# Altium footprint library RPSLib_Connectors.PcbLib: 85 footprints (part 4 of 6)
Each footprint in its own frame and in the unit in brackets; x right, y up, seen from the top. Pads: shape width x height; smd on the part's side, far side on the other; paste and mask are expansions set on the pad; w line width, h text height; cw(c..) or ccw(c..) is an arc to the next point about the centre after c.
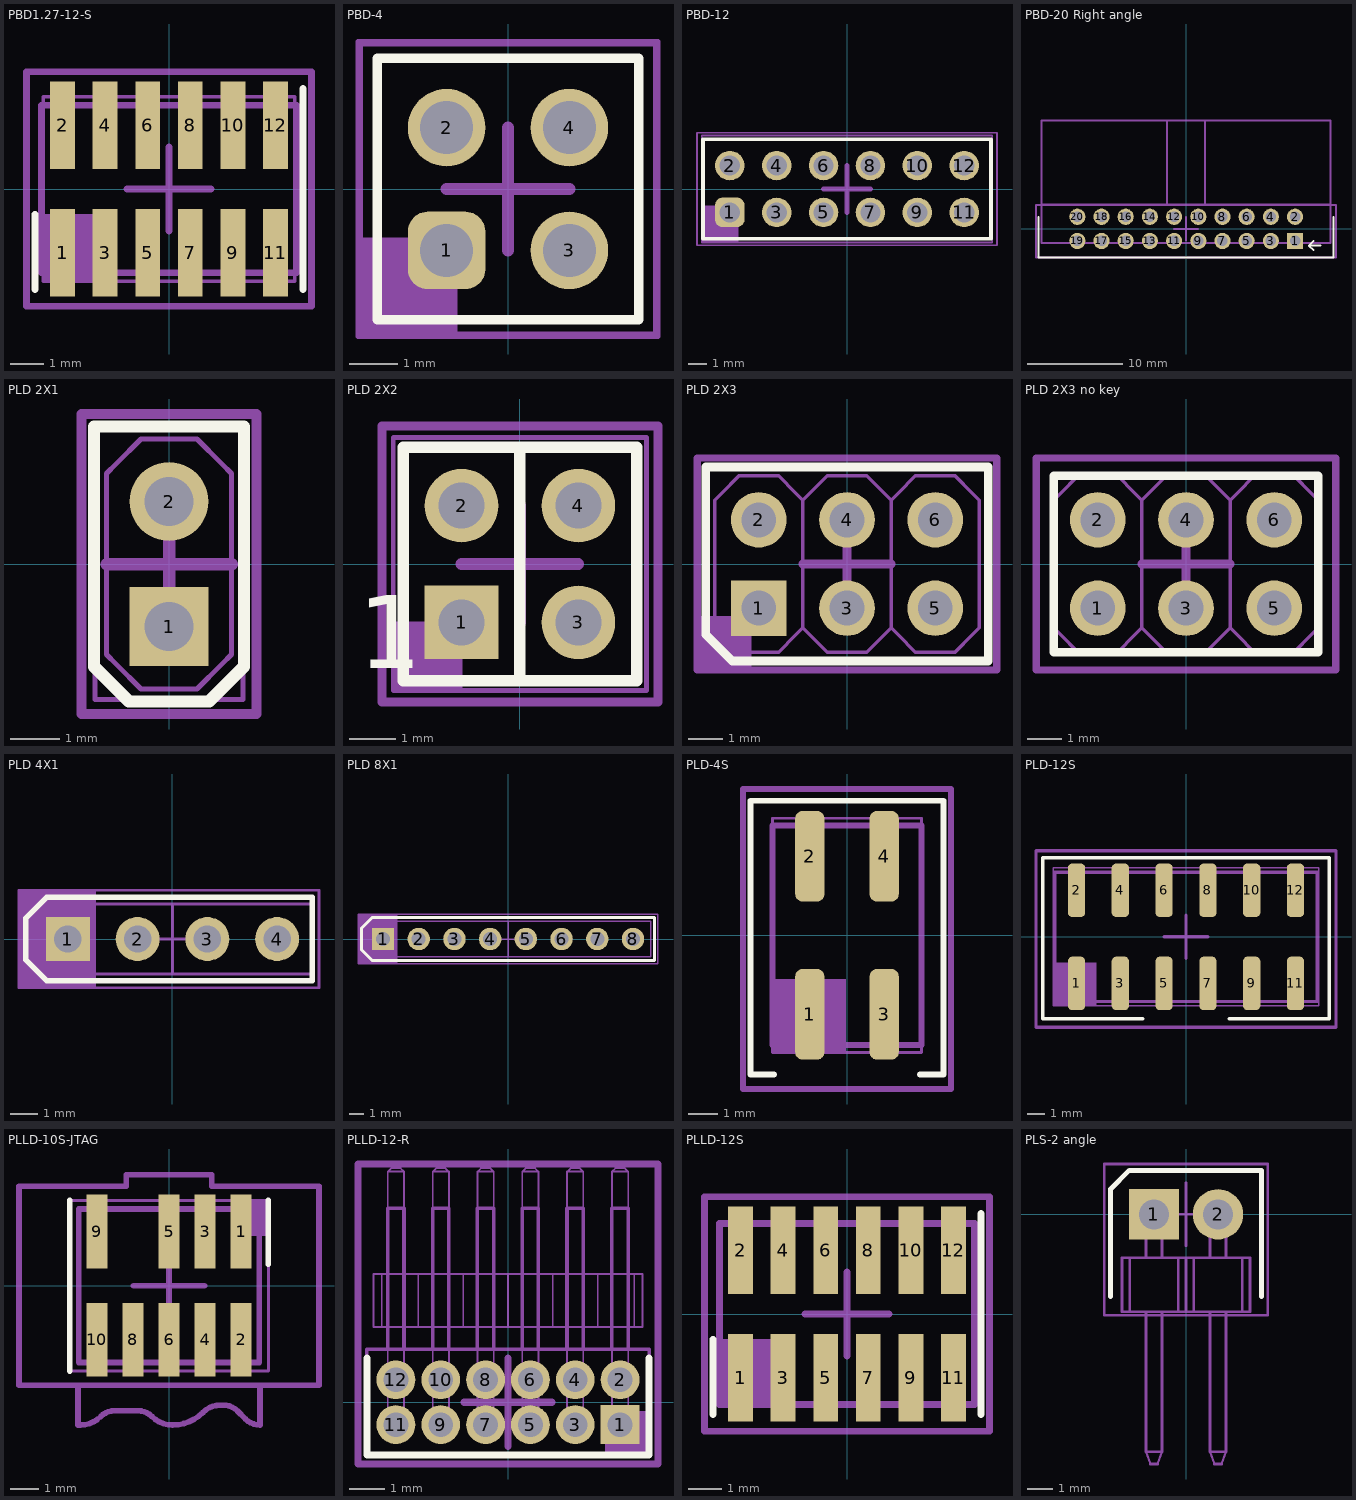
[diagram p3: the footprints below, top view; thin cyan lines are the x and y axes]

## PBD1.27-12-S [mm]
height 4.5
pads (12):
  rect 0.74x2.6 smd mask+0.07: 1(-3.175,-1.9) 2(-3.175,1.9) 3(-1.905,-1.9) 4(-1.905,1.9) 5(-0.635,-1.9) 6(-0.635,1.9) 7(0.635,-1.9) 8(0.635,1.9) 9(1.905,-1.9) 10(1.905,1.9) 11(3.175,-1.9) 12(3.175,1.9)
Top Overlay:
  lines w0.2: -4,-3 -4,-0.75 ; 4,-3 4,3
Top Designator:
  rectangle: -3.75,-2.75 -1.75,-0.75
  lines w0.1: -3.75,-2.75 3.75,-2.75 3.75,2.75 -3.75,2.75 -3.75,-2.75
  text ".Designator" at -2.868,-0.271 h1.2
Top Courtyard:
  lines w0.2: -1.25,0 1.25,0 ; 0,-1.25 0,1.25 ; -4.25,-3.5 -4.25,3.5 4.25,3.5 4.25,-3.5 -4.25,-3.5
Top 3D Body:
  lines w0.2: -3.81,-2.5 -3.81,2.5 3.81,2.5 3.81,-2.5 -3.81,-2.5
20:
  text ".Designator" at -1.126,-0.113 h0.5
3D body "User Library-PBD1_27-xx-S.step": height 4.5, standoff 0, extent -3.81,-2.5 3.81,2.5

## PBD-4 [mm] "Розетка двухрядная"
height 8.5
pads (4):
  rrect50% 1.6x1.6 hole 1.1: 1(-1.27,-1.27)
  round 1.6 hole 1.1: 2(-1.27,1.27) 3(1.27,-1.27) 4(1.27,1.27)
Top Overlay:
  lines w0.2: -2.7,-2.7 2.7,-2.7 2.7,2.7 -2.7,2.7 -2.7,-2.7
Top Designator:
  rectangle: -3.048,-3 -1.048,-1
  lines w0.1: -3.048,-3 -3.048,3 3.048,3 3.048,-3 -3.048,-3
  text ".Designator" at -2.868,-0.271 h1.2
Top Courtyard:
  lines w0.1: -3.1,-3.048 3.1,-3.048 3.1,3.048 -3.1,3.048 -3.1,-3.048
  lines w0.254: -1.27,0 1.27,0 ; 0,-1.27 0,1.27
20:
  text ".Designator" at -2.253,-0.226 h1
3D body "PBD-4.stp": height 8.5, standoff -3.1, extent -2.54,-2.54 2.54,2.54

## PBD-12 [mm] "Розетка двухрядная"
height 8.5
pads (12):
  rrect50% 1.6x1.6 hole 1.1: 1(-6.35,-1.27)
  round 1.6 hole 1.1: 2(-6.35,1.27) 3(-3.81,-1.27) 4(-3.81,1.27) 5(-1.27,-1.27) 6(-1.27,1.27) 7(1.27,-1.27) 8(1.27,1.27) 9(3.81,-1.27) 10(3.81,1.27) 11(6.35,-1.27) 12(6.35,1.27)
Top Overlay:
  lines w0.2: -7.8,-2.7 -7.8,2.7 7.8,2.7 7.8,-2.7 -7.8,-2.7
Top Designator:
  rectangle: -7.874,-2.9 -5.874,-0.9
  lines w0.1: -7.874,-2.9 7.874,-2.9 7.874,2.9 -7.874,2.9 -7.874,-2.9
  text ".Designator" at -2.868,-0.271 h1.2
Top Courtyard:
  lines w0.1: -8.128,-3.048 -8.128,3.048 8.128,3.048 8.128,-3.048 -8.128,-3.048
  lines w0.254: -1.27,0 1.27,0 ; 0,-1.27 0,1.27
20:
  text ".Designator" at -2.253,-0.226 h1
3D body "PBD-12.stp": height 8.5, standoff -3.1, extent -7.62,-2.54 7.62,2.54

## PBD-20 Right angle [mm] "2.54 мм разъем правый"
height 9.1
pads (20):
  rect 1.7x1.7 hole 1.1: 1(11.45,-1.27)
  round 1.7 hole 1.1: 2(11.45,1.27) 3(8.91,-1.27) 4(8.91,1.27) 5(6.37,-1.27) 6(6.37,1.27) 7(3.83,-1.27) 8(3.83,1.27) 9(1.29,-1.27) 10(1.29,1.27) 11(-1.25,-1.27) 12(-1.25,1.27) 13(-3.79,-1.27) 14(-3.79,1.27) 15(-6.33,-1.27) 16(-6.33,1.27) 17(-8.87,-1.27) 18(-8.87,1.27) 19(-11.41,-1.27) 20(-11.41,1.27)
Top Overlay:
  lines w0.2: -15.5,1.25 -15.5,-3 15.5,-3 15.5,1.25 ; 13.403,-2.25 12.903,-1.75 ; 13.403,-1.25 12.903,-1.75 ; 14.153,-1.75 12.903,-1.75
Top Designator:
  text ".Designator" at -2.868,-0.271 h1.2
Top Courtyard:
  lines w0.2: -1.25,0 1.25,0 ; 0,-1.25 0,1.25 ; -15.75,-3 -15.75,2.5 15.75,2.5 15.75,-3 -15.75,-3
Top 3D Body:
  lines w0.2: -15.16,2.548 15.16,2.548 ; -2,11.37 -2,2.548 2,2.548 2,11.37 ; -15.16,-1.47 15.16,-1.47 15.16,11.37 -15.16,11.37 -15.16,-1.47
3D body "PBD-20.stp": height 7.1, standoff -2.7, extent -15.16,-1.47 15.16,11.37

## PLD 2X1 [mm]
pads (2):
  rect 1.6x1.6 hole 1: 1(0,-1.27)
  round 1.6 hole 1: 2(0,1.27)
Top Overlay:
  lines w0.25: -1.524,-2.086 -0.816,-2.794 0.816,-2.794 1.524,-2.086 1.524,2.794 -1.524,2.794 -1.524,-2.086
Top Designator:
  lines w0.1: -1.5,-2.75 1.5,-2.75 1.5,2.75 -1.5,2.75 -1.5,-2.75
  text ".Designator" at -2.868,-0.271 h1.2
Top Courtyard:
  lines w0.2: -1.778,-3.048 -1.778,3.048 1.778,3.048 1.778,-3.048 -1.778,-3.048
  lines w0.254: -1.27,0 1.27,0 ; 0,-1.27 0,1.27
Top 3D Body:
  lines w0.1: -1.27,-1.84 -1.07,-2.04 -0.57,-2.54 0.57,-2.54 1.07,-2.04 1.27,-1.84 ; -1.27,-1.84 -1.27,1.84 ; -1.27,-1.84 -1.27,1.84 ; -1.27,1.84 -1.07,2.04 -0.57,2.54 0.57,2.54 1.07,2.04 1.27,1.84 ; 1.27,-1.84 1.27,1.84 ; 1.27,-1.84 1.27,1.84 ; -0.32,-1.59 -0.32,-0.95 0.32,-0.95 0.32,-1.59 -0.32,-1.59 ; -0.32,0.95 -0.32,1.59 0.32,1.59 0.32,0.95 -0.32,0.95
20:
  text ".Designator" at 0.226,-2.253 h1
3D body "PLD-2x1.stp": height 8.54, standoff -3, extent -1.27,-2.54 1.27,2.54

## PLD 2X2 [mm]
pads (4):
  rect 1.6x1.6 hole 1: 1(-1.27,-1.27)
  round 1.6 hole 1: 2(-1.27,1.27) 3(1.27,-1.27) 4(1.27,1.27)
Top Overlay:
  lines w0.25: 0,-2.54 0,2.54 ; -2.54,-2.54 -2.54,2.54 2.54,2.54 2.54,-2.54 -2.54,-2.54
  text "1" at -3.52,-2.27 h1.59
Top Designator:
  rectangle: -2.75,-2.75 -1.25,-1.25
  lines w0.1: -2.75,-2.75 -2.75,2.75 2.75,2.75 2.75,-2.75 -2.75,-2.75
  text ".Designator" at -2.868,-0.271 h1.2
Top Courtyard:
  lines w0.2: -3,-3 -3,3 3,3 3,-3 -3,-3
  lines w0.254: -1.27,0 1.27,0 ; 0,-1.27 0,1.27
Top 3D Body:
  lines w0.2: -2.54,-2.54 -2.54,2.54 2.54,2.54 2.54,-2.54 -2.54,-2.54
20:
  text ".Designator" at -2.253,-0.226 h1
3D body "PLD-4.stp": height 8, standoff -3, extent -2.54,-2.54 2.54,2.54

## PLD 2X3 [mm]
pads (6):
  rect 1.6x1.6 hole 1: 1(-2.54,-1.27)
  round 1.6 hole 1: 2(-2.54,1.27) 3(0,-1.27) 4(0,1.27) 5(2.54,-1.27) 6(2.54,1.27)
Top Overlay:
  lines w0.25: -4.064,-2.032 -3.302,-2.794 4.064,-2.794 4.064,2.794 -4.064,2.794 -4.064,-2.032
Top Designator:
  rectangle: -4.25,-3 -2.75,-1.5
  lines w0.1: -4.25,-3 -4.25,3 4.25,3 4.25,-3 -4.25,-3
  text ".Designator" at -2.868,-0.271 h1.2
Top Courtyard:
  lines w0.2: -4.318,-3.048 4.318,-3.048 4.318,3.048 -4.318,3.048 -4.318,-3.048
  lines w0.254: -1.27,0 1.27,0 ; 0,-1.27 0,1.27
Top 3D Body:
  lines w0.1: -1.27,-1.84 -1.27,1.84 ; -1.27,-1.84 -1.27,1.84 ; -1.27,-1.84 -1.47,-2.04 -1.97,-2.54 -3.11,-2.54 -3.61,-2.04 -3.81,-1.84 -3.81,1.84 -3.61,2.04 -3.11,2.54 -1.97,2.54 -1.47,2.04 -1.27,1.84 ; -1.27,-1.84 -1.07,-2.04 -0.57,-2.54 0.57,-2.54 1.07,-2.04 1.27,-1.84 ; -1.27,1.84 -1.07,2.04 -0.57,2.54 0.57,2.54 1.07,2.04 1.27,1.84 ; 1.27,-1.84 1.27,1.84 ; 1.27,-1.84 1.27,1.84 ; 1.27,-1.84 1.47,-2.04 1.97,-2.54 3.11,-2.54 3.61,-2.04 3.81,-1.84 3.81,1.84 3.61,2.04 3.11,2.54 1.97,2.54 1.47,2.04 1.27,1.84 ; -2.86,-1.59 -2.22,-1.59 -2.22,-0.95 -2.86,-0.95 -2.86,-1.59 ; -2.86,0.95 -2.86,1.59 -2.22,1.59 -2.22,0.95 -2.86,0.95 ; -0.32,-1.59 0.32,-1.59 0.32,-0.95 -0.32,-0.95 -0.32,-1.59 ; -0.32,0.95 0.32,0.95 0.32,1.59 -0.32,1.59 -0.32,0.95 ; 2.22,-1.59 2.86,-1.59 2.86,-0.95 2.22,-0.95 2.22,-1.59 ; 2.22,0.95 2.22,1.59 2.86,1.59 2.86,0.95 2.22,0.95
20:
  text ".Designator" at -2.253,-0.226 h1
3D body "PLD-6.stp": height 8.54, standoff -3, extent -3.81,-2.54 3.81,2.54

## PLD 2X3 no key [mm]
pads (6):
  round 1.6 hole 1: 1(-2.54,-1.27) 2(-2.54,1.27) 3(0,-1.27) 4(0,1.27) 5(2.54,-1.27) 6(2.54,1.27)
Top Overlay:
  lines w0.25: -3.81,-2.54 -3.81,2.54 3.81,2.54 3.81,-2.54 -3.81,-2.54
Top Designator:
  lines w0.1: -4.25,-3 4.25,-3 4.25,3 -4.25,3 -4.25,-3
  text ".Designator" at -2.868,-0.271 h1.2
Top Courtyard:
  lines w0.2: -4.318,-3.048 -4.318,3.048 4.318,3.048 4.318,-3.048 -4.318,-3.048
  lines w0.254: -1.27,0 1.27,0 ; 0,-1.27 0,1.27
Top 3D Body:
  lines w0.1: -1.27,-1.84 -1.07,-2.04 -0.57,-2.54 0.57,-2.54 1.07,-2.04 1.27,-1.84 ; -1.27,-1.84 -1.47,-2.04 -1.97,-2.54 -3.11,-2.54 -3.61,-2.04 -3.81,-1.84 -3.81,1.84 -3.61,2.04 -3.11,2.54 -1.97,2.54 -1.47,2.04 -1.27,1.84 ; -1.27,-1.84 -1.27,1.84 ; -1.27,-1.84 -1.27,1.84 ; -1.27,1.84 -1.07,2.04 -0.57,2.54 0.57,2.54 1.07,2.04 1.27,1.84 ; 1.27,-1.84 1.47,-2.04 1.97,-2.54 3.11,-2.54 3.61,-2.04 3.81,-1.84 3.81,1.84 3.61,2.04 3.11,2.54 1.97,2.54 1.47,2.04 1.27,1.84 ; 1.27,-1.84 1.27,1.84 ; 1.27,-1.84 1.27,1.84 ; -2.86,-1.59 -2.86,-0.95 -2.22,-0.95 -2.22,-1.59 -2.86,-1.59 ; -2.86,0.95 -2.22,0.95 -2.22,1.59 -2.86,1.59 -2.86,0.95 ; -0.32,-1.59 -0.32,-0.95 0.32,-0.95 0.32,-1.59 -0.32,-1.59 ; -0.32,0.95 -0.32,1.59 0.32,1.59 0.32,0.95 -0.32,0.95 ; 2.22,-1.59 2.22,-0.95 2.86,-0.95 2.86,-1.59 2.22,-1.59 ; 2.22,0.95 2.86,0.95 2.86,1.59 2.22,1.59 2.22,0.95
3D body "PLD-6.stp": height 8.54, standoff -3, extent -3.81,-2.54 3.81,2.54

## PLD 4X1 [mm] "1x4 Male Header Through Hole Pitch 2.54 mm"
height 9.2
pads (4):
  rect 1.6x1.6 hole 1: 1(-3.81,0)
  round 1.6 hole 1: 2(-1.27,0) 3(1.27,0) 4(3.81,0)
Top Overlay:
  lines w0.2: -5.334,-0.762 -5.334,0.762 -4.572,1.524 5.08,1.524 5.08,-1.524 -4.572,-1.524 -5.334,-0.762
Top Designator:
  rectangle: -5.588,-1.778 -2.786,1.778
  lines w0.1: -5.588,-1.778 -5.588,1.778 5.334,1.778 5.334,-1.778 -5.588,-1.778
  text ".Designator" at -2.868,-0.271 h1.2
Top Courtyard:
  lines w0.1: -1.27,0 1.27,0 ; 0,-1.27 0,1.27 ; -5.588,-1.778 5.334,-1.778 5.334,1.778 -5.588,1.778 -5.588,-1.778
Top 3D Body:
  lines w0.1: -5.08,-1.27 -5.08,1.27 5.08,1.27 5.08,-1.27 -5.08,-1.27
20:
  text ".Designator" at -2.045,-0.226 h1
3D body "User Library-1x4 TH Pitch 2_54mm.STEP": height 9.2, standoff -3.5, extent -5.08,-1.27 5.08,1.27

## PLD 8X1 [mm] "1x8 Male Header Through Hole Pitch 2.54 mm"
height 9.2
pads (8):
  rect 1.6x1.6 hole 1: 1(-8.89,0)
  round 1.6 hole 1: 2(-6.35,0) 3(-3.81,0) 4(-1.27,0) 5(1.27,0) 6(3.81,0) 7(6.35,0) 8(8.89,0)
Top Overlay:
  lines w0.2: -10.414,-0.762 -9.652,-1.524 10.414,-1.524 10.414,1.524 -9.652,1.524 -10.414,0.762 -10.414,-0.762
Top Designator:
  rectangle: -10.668,-1.778 -7.866,1.778
  lines w0.1: -10.668,-1.778 10.668,-1.778 10.668,1.778 -10.668,1.778 -10.668,-1.778
  text ".Designator" at -2.868,-0.271 h1.2
Top Courtyard:
  lines w0.1: -1.27,0 1.27,0 ; 0,-1.27 0,1.27 ; -10.668,-1.778 -10.668,1.778 10.668,1.778 10.668,-1.778 -10.668,-1.778
Top 3D Body:
  lines w0.1: -10.16,-1.27 -10.16,1.27 10.16,1.27 10.16,-1.27 -10.16,-1.27
20:
  text ".Designator" at -2.253,-0.226 h1
3D body "User Library-1x8 TH Pitch 2_54mm.STEP": height 9.2, standoff -3.5, extent -10.16,-1.27 10.16,1.27

## PLD-4S [mm] "2.54 мм разъем SMD"
height 9.6
pads (4):
  rrect50% 1x3.1 smd mask+0.07: 1(-1.27,-2.7) 2(-1.27,2.7) 3(1.27,-2.7) 4(1.27,2.7)
Top Overlay:
  lines w0.2: -2.5,-4.75 -3.302,-4.75 -3.302,4.6 3.302,4.6 3.302,-4.75 2.5,-4.75
Top Designator:
  rectangle: -2.54,-4 -0.04,-1.5
  lines w0.1: -2.54,-4 -2.54,4 2.54,4 2.54,-4 -2.54,-4
  text ".Designator" at -2.868,-0.271 h1.2
Top Courtyard:
  lines w0.2: -3.556,-5.25 -3.556,5 3.556,5 3.556,-5.25 -3.556,-5.25
Top 3D Body:
  lines w0.2: -2.54,-3.75 2.54,-3.75 2.54,3.75 -2.54,3.75 -2.54,-3.75
3D body "PLD-04S.stp": height 9.6, standoff 0, extent -2.54,-3.75 2.54,3.75

## PLD-12S [mm] "2.54 мм разъем SMD"
height 9.6
pads (12):
  rrect50% 1x3.1 smd mask+0.07: 1(-6.35,-2.7) 2(-6.35,2.7) 3(-3.81,-2.7) 4(-3.81,2.7) 5(-1.27,-2.7) 6(-1.27,2.7) 7(1.27,-2.7) 8(1.27,2.7) 9(3.81,-2.7) 10(3.81,2.7) 11(6.35,-2.7) 12(6.35,2.7)
Top Overlay:
  lines w0.2: -2.5,-4.75 -8.3,-4.75 -8.3,4.6 8.3,4.6 8.3,-4.75 2.5,-4.75
Top Designator:
  rectangle: -7.7,-4 -5.2,-1.5
  lines w0.1: -7.7,-4 -7.7,4 7.7,4 7.7,-4 -7.7,-4
  text ".Designator" at -2.868,-0.271 h1.2
Top Courtyard:
  lines w0.2: -1.25,0 1.25,0 ; 0,-1.25 0,1.25 ; -8.7,-5.25 -8.7,5 8.7,5 8.7,-5.25 -8.7,-5.25
Top 3D Body:
  lines w0.2: -7.62,-3.75 7.62,-3.75 7.62,3.75 -7.62,3.75 -7.62,-3.75
20:
  text ".Designator" at -1.126,-0.113 h0.5
3D body "PLD-12S.stp": height 9.6, standoff 0, extent -7.62,-3.75 7.62,3.75

## PLLD-10S-JTAG [mm]
height 4.5
pads (9):
  rect 0.74x2.6 smd mask+0.07: 1(2.54,1.9) 2(2.54,-1.9) 3(1.27,1.9) 4(1.27,-1.9) 5(0,1.9) 6(0,-1.9) 8(-1.27,-1.9) 9(-2.54,1.9) 10(-2.54,-1.9)
Top Overlay:
  lines w0.2: -3.492,-3 -3.492,3 ; 3.492,0.75 3.492,3
Top Designator:
  rectangle: 2.25,1.75 3.5,3
  lines w0.1: -3.5,-3 -3.5,3 3.5,3 3.5,-3 -3.5,-3
  text ".Designator" at -2.868,-0.271 h1.2
Top Courtyard:
  lines w0.2: -3.2,-3.5 -3.2,-4.9 -3.124,-4.9 ccw(c-3.124,-3.876) -2.4,-4.6 cw(c-1.917,-5.083) -1.917,-4.4 -1.083,-4.4 cw(c-1.083,-5.083) -0.6,-4.6 ccw(c0.124,-3.876) 0.124,-4.9 ccw(c0.124,-3.389) 1.192,-4.458 1.203,-4.447 cw(c1.8,-5.045) 1.8,-4.2 1.917,-4.2 cw(c1.917,-4.883) 2.4,-4.4 2.688,-4.688 ccw(c3.2,-4.176) 3.2,-4.9 3.2,-3.5 ; -1.25,0 1.25,0 ; 0,-1.25 0,1.25 ; -5.275,-3.5 -5.275,3.5 -1.5,3.5 -1.5,3.9 1.5,3.9 1.5,3.5 5.275,3.5 5.275,-3.5 -5.275,-3.5
Top 3D Body:
  lines w0.2: -3.175,-2.7 -3.175,2.7 3.175,2.7 3.175,-2.7 -3.175,-2.7
20:
  text ".Designator" at -1.126,-0.113 h0.5
3D body "KLS1-207C-2-10-T-JTAG.stp": height 4.46, standoff 0, extent -3.175,-2.7 3.175,2.7

## PLLD-12-R [mm]
height 3.4
pads (12):
  rect 1.1x1.1 hole 0.7 mask+0.07: 1(3.175,-0.635)
  round 1.1 hole 0.7 mask+0.07: 2(3.175,0.635) 3(1.905,-0.635) 4(1.905,0.635) 5(0.635,-0.635) 6(0.635,0.635) 7(-0.635,-0.635) 8(-0.635,0.635) 9(-1.905,-0.635) 10(-1.905,0.635) 11(-3.175,-0.635) 12(-3.175,0.635)
Top Overlay:
  lines w0.2: -4,1.25 -4,-1.5 4,-1.5 4,1.25
Top Designator:
  rectangle: 2.75,-1.5 4,-0.25
  lines w0.1: -3.408,1.5 -3.408,5.5 -2.947,5.5 -2.947,1.5 ; -2.138,1.5 -2.138,5.5 -1.677,5.5 -1.677,1.5 ; -0.868,1.5 -0.868,5.5 -0.407,5.5 -0.407,1.5 ; 0.402,1.5 0.402,5.5 0.863,5.5 0.863,1.5 ; 1.672,1.5 1.672,5.5 2.133,5.5 2.133,1.5 ; 2.942,1.5 2.942,5.5 3.403,5.5 3.403,1.5 ; -4,-1.5 -4,1.5 4,1.5 4,-1.5 -4,-1.5
  text ".Designator" at -2.868,-0.271 h1.2
Top Courtyard:
  lines w0.2: -1.25,0 1.25,0 ; 0,-1.25 0,1.25 ; -4.25,-1.75 4.25,-1.75 4.25,6.75 -4.25,6.75 -4.25,-1.75
Top 3D Body:
  lines w0.05: -3.405,2.135 -3.405,0.095 -3.405,-0.865 -2.945,-0.865 -2.945,0.095 -2.945,2.135 ; -3.405,3.635 -3.405,6.535 ; -2.945,3.635 -2.945,6.535 ; -2.135,2.135 -2.135,0.095 -2.135,-0.865 -1.675,-0.865 -1.675,0.095 -1.675,2.135 ; -2.135,3.635 -2.135,6.535 ; -1.675,3.635 -1.675,6.535 ; -0.865,2.135 -0.865,0.095 -0.865,-0.865 -0.405,-0.865 -0.405,0.095 -0.405,2.135 ; -0.865,3.635 -0.865,6.535 ; -0.405,3.635 -0.405,6.535 ; 0.405,2.135 0.405,0.095 0.405,-0.865 0.865,-0.865 0.865,0.095 0.865,2.135 ; 0.405,3.635 0.405,6.535 ; 0.865,3.635 0.865,6.535 ; 1.675,2.135 1.675,0.095 1.675,-0.865 2.135,-0.865 2.135,0.095 2.135,2.135 ; 1.675,3.635 1.675,6.535 ; 2.135,3.635 2.135,6.535 ; 2.945,2.135 2.945,0.095 2.945,-0.865 3.405,-0.865 3.405,0.095 3.405,2.135 ; 2.945,3.635 2.945,6.535 ; 3.405,3.635 3.405,6.535 ; -3.579,2.135 -3.579,3.635 ; -3.579,2.135 -3.81,2.135 -3.81,3.635 -3.579,3.635 ; -3.579,2.135 -2.771,2.135 -2.54,2.135 ; -3.579,3.635 -2.771,3.635 -2.54,3.635 ; -3.405,6.535 -2.945,6.535 ; -3.405,6.535 -3.305,6.635 -3.045,6.635 -2.945,6.535 ; -2.54,2.135 -2.54,3.635 ; -2.54,2.135 -2.309,2.135 -1.501,2.135 -1.27,2.135 ; -2.54,3.635 -2.309,3.635 -1.501,3.635 -1.27,3.635 ; -2.135,6.535 -1.675,6.535 ; -2.135,6.535 -2.035,6.635 -1.775,6.635 -1.675,6.535 ; -1.27,2.135 -1.27,3.635 ; -1.27,2.135 -1.039,2.135 -0.231,2.135 0,2.135 ; -1.27,3.635 -1.039,3.635 -0.231,3.635 0,3.635 ; -0.865,6.535 -0.405,6.535 ; -0.865,6.535 -0.765,6.635 -0.505,6.635 -0.405,6.535 ; 0,2.135 0.231,2.135 1.039,2.135 1.27,2.135 ; 0,2.135 0,3.635 ; 0,3.635 0.231,3.635 1.039,3.635 1.27,3.635 ; 0.405,6.535 0.865,6.535 ; 0.405,6.535 0.505,6.635 0.765,6.635 0.865,6.535 ; 1.27,2.135 1.501,2.135 2.309,2.135 2.54,2.135 ; 1.27,2.135 1.27,3.635 ; 1.27,3.635 1.501,3.635 2.309,3.635 2.54,3.635 ; 1.675,6.535 2.135,6.535 ; 1.675,6.535 1.775,6.635 2.035,6.635 2.135,6.535 ; 2.54,2.135 2.771,2.135 3.579,2.135 ; 2.54,2.135 2.54,3.635 ; 2.54,3.635 2.771,3.635 3.579,3.635 ; 2.945,6.535 3.405,6.535 ; 2.945,6.535 3.045,6.635 3.305,6.635 3.405,6.535 ; 3.579,2.135 3.81,2.135 3.81,3.635 3.579,3.635 ; 3.579,2.135 3.579,3.635
20:
  text ".Designator" at -1.126,-0.113 h0.5
3D body "PLLD-12-R.stp": height 3.4, standoff -2.8, extent -3.81,-0.865 3.81,6.635

## PLLD-12S [mm]
height 4.5
pads (12):
  rect 0.74x2.6 smd mask+0.07: 1(-3.175,-1.9) 2(-3.175,1.9) 3(-1.905,-1.9) 4(-1.905,1.9) 5(-0.635,-1.9) 6(-0.635,1.9) 7(0.635,-1.9) 8(0.635,1.9) 9(1.905,-1.9) 10(1.905,1.9) 11(3.175,-1.9) 12(3.175,1.9)
Top Overlay:
  lines w0.2: -4,-3 -4,-0.75 ; 4,-3 4,3
Top Designator:
  rectangle: -3.75,-2.75 -1.75,-0.75
  lines w0.1: -3.75,-2.75 -3.75,2.75 3.75,2.75 3.75,-2.75 -3.75,-2.75
  text ".Designator" at -2.868,-0.271 h1.2
Top Courtyard:
  lines w0.2: -1.25,0 1.25,0 ; 0,-1.25 0,1.25 ; -4.25,-3.5 -4.25,3.5 4.25,3.5 4.25,-3.5 -4.25,-3.5
Top 3D Body:
  lines w0.2: -3.81,-2.7 -3.81,2.7 3.81,2.7 3.81,-2.7 -3.81,-2.7
20:
  text ".Designator" at -1.126,-0.113 h0.5
3D body "User Library-KLS1-207C-2-12-T.step": height 4.46, standoff 0, extent -3.81,-2.7 3.81,2.7

## PLS-2 angle [mm] "Разъем PLS 2 контакта, угловой"
height 2.5
pads (2):
  rect 2x2 hole 1.2 unplated mask+0.07: 1(-1.27,0)
  round 2 hole 1.2 unplated mask+0.07: 2(1.27,0)
Top Overlay:
  lines w0.2: -3,-3.25 -3,1 -2.25,1.75 3,1.75 3,-3.25
Top Designator:
  text ".Designator" at -2.868,-0.271 h1.2
Top Courtyard:
  lines w0.1: -1.25,0 1.25,0 ; 0,-1.25 0,1.25 ; -3.25,-4 -3.25,2 3.25,2 3.25,-4 -3.25,-4
Top 3D Body:
  lines w0.1: -1.587,-3.861 -1.587,-9.417 ; -1.587,-1.727 -1.587,-0.953 -1.587,0.318 -0.953,0.318 -0.953,-0.953 -0.953,-1.727 ; -0.953,-3.861 -0.953,-9.417 ; 0.953,-3.861 0.953,-9.417 ; 0.953,-1.727 0.953,-0.953 0.953,0.318 1.587,0.318 1.587,-0.953 1.587,-1.727 ; 1.587,-3.861 1.587,-9.417 ; -2.235,-3.861 -2.54,-3.861 -2.54,-1.727 -2.235,-1.727 ; -2.235,-3.861 -2.235,-1.727 ; -2.235,-3.861 -0.305,-3.861 ; -2.235,-1.727 -0.305,-1.727 ; -1.587,-9.417 -0.953,-9.417 ; -1.587,-9.417 -1.41,-9.906 -1.13,-9.906 -0.953,-9.417 ; -0.305,-3.861 -0.305,-1.727 ; -0.305,-3.861 0,-3.861 ; -0.305,-1.727 0,-1.727 ; 0,-3.861 0.305,-3.861 ; 0,-3.861 0,-1.727 ; 0,-1.727 0.305,-1.727 ; 0.305,-3.861 0.305,-1.727 ; 0.305,-3.861 2.235,-3.861 ; 0.305,-1.727 2.235,-1.727 ; 0.953,-9.417 1.587,-9.417 ; 0.953,-9.417 1.13,-9.906 1.41,-9.906 1.587,-9.417 ; 2.235,-3.861 2.54,-3.861 2.54,-1.727 2.235,-1.727 ; 2.235,-3.861 2.235,-1.727
3D body "PLS-2 pin angle.stp": height 2.41, standoff -2.98, extent -2.54,-9.906 2.54,0.318